# Altium footprint library Miscellaneous SMD.PcbLib: 82 footprints (part 2 of 7)
Each footprint in its own frame and in the unit in brackets; x right, y up, seen from the top. Pads: shape width x height; smd on the part's side, far side on the other; paste and mask are expansions set on the pad; w line width, h text height; cw(c..) or ccw(c..) is an arc to the next point about the centre after c.
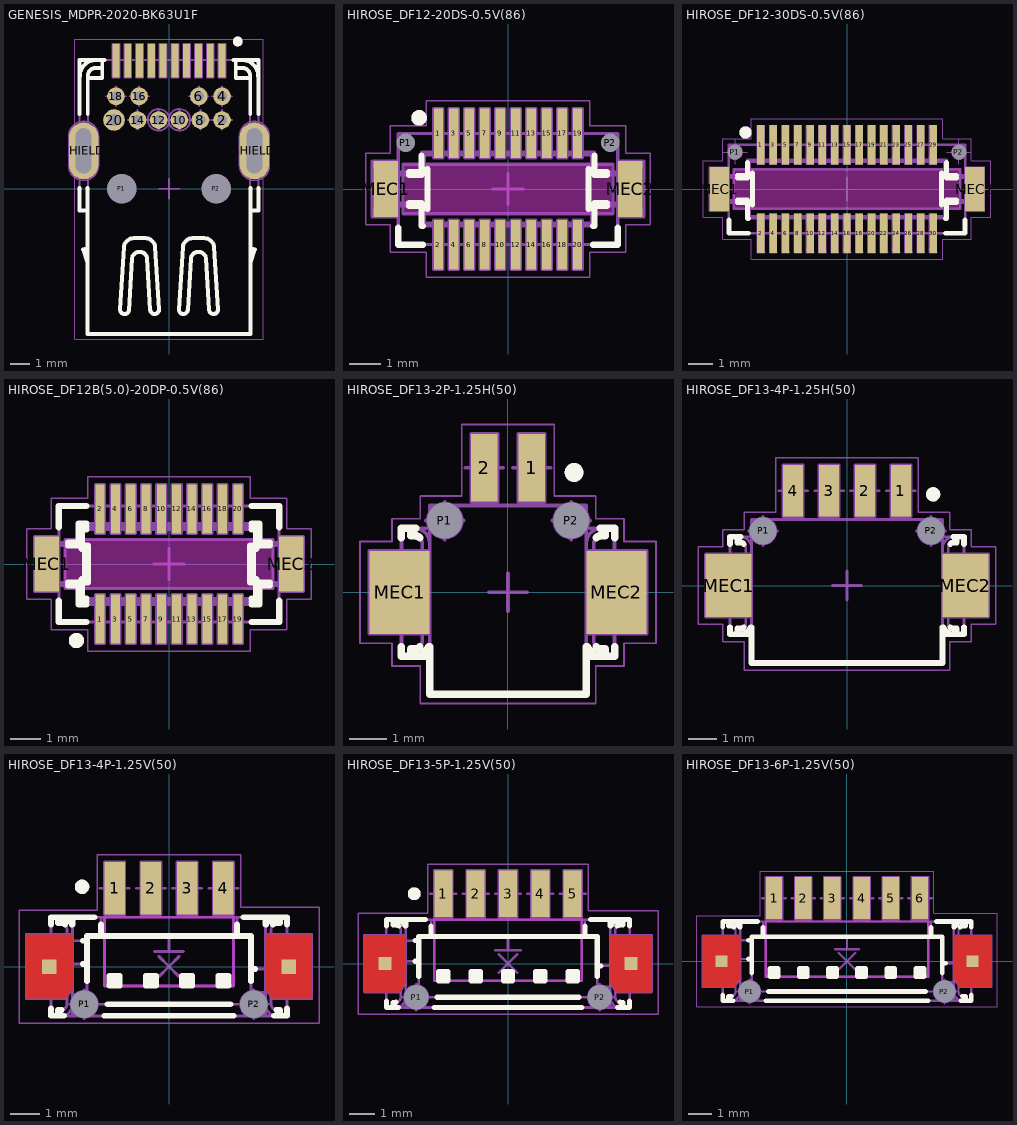
[diagram p1: the footprints below, top view; thin cyan lines are the x and y axes]

## GENESIS_MDPR-2020-BK63U1F [mm] "0.6mm Pitch, Mini DisplayPort Receptacle, 20 Positions, Right Angled"
height 8.2
pads (24):
  rect 0.35x1.7 smd: 1(2.7,6.52) 3(2.1,6.52) 5(1.5,6.52) 7(0.9,6.52) 9(0.3,6.52) 11(-0.3,6.52) 13(-0.9,6.52) 15(-1.5,6.52) 17(-2.1,6.52) 19(-2.7,6.52)
  round 0.9 hole 0.5: 2(2.7,3.5) 4(2.7,4.71) 6(1.52,4.71) 8(1.6,3.5) 10(0.53,3.5) 12(-0.53,3.5) 14(-1.6,3.5) 16(-1.52,4.71) 18(-2.7,4.71)
  round 1.1 hole 0.6: 20(-2.8,3.5)
  round 0.5 hole 1.5 unplated mask+0.5: P1(-2.4,0) P2(2.4,0)
  oval 1.5x2.9 hole 0.8 slot 2.3 at 90 deg: SHIELD(-4.35,1.93) SHIELD(4.35,1.93)
Top Overlay:
  circle w0.25: c3.5,7.5 r0.125
  lines w0.2: -4.55,0.048 -4.55,-1.11 -4.15,-1.11 ; -4.55,3.812 -4.55,6.552 -3.275,6.552 ; -4.536,5.752 cw(c-3.736,5.752) -3.75,6.552 ; -4.146,-3.745 -4.369,-3.098 -4.145,-3.021 ; -4.142,0.049 -4.15,-7.4 4.15,-7.4 4.142,0.049 ; -4.138,3.81 -4.136,5.752 cw(c-3.736,5.752) -3.743,6.152 -3.4,6.152 ; -4.136,5.63 -3.4,5.63 -3.4,6.552 ; 3.275,6.552 4.55,6.552 4.55,3.812 ; 3.4,6.152 3.743,6.152 cw(c3.736,5.752) 4.136,5.752 4.138,3.81 ; 3.4,6.552 3.4,5.63 4.136,5.63 ; 3.75,6.552 cw(c3.736,5.752) 4.536,5.752 ; 4.145,-3.021 4.369,-3.098 ; 4.146,-3.745 4.369,-3.097 ; 4.15,-1.11 4.55,-1.11 4.55,0.048 ; -2.492,-6.137 ccw(c-2.264,-6.149) -2.042,-6.2 -1.887,-3.551 cw(c-1.5,-3.605) -1.113,-3.551 -0.958,-6.167 ccw(c-0.733,-6.151) -0.508,-6.137 -0.707,-2.984 ccw(c-1.206,-3.016) -1.206,-2.516 -1.794,-2.516 ccw(c-1.794,-3.016) -2.293,-2.984 -2.492,-6.137 ; 0.508,-6.151 ccw(c0.733,-6.151) 0.958,-6.166 1.113,-3.551 cw(c1.5,-3.605) 1.887,-3.551 2.042,-6.166 ccw(c2.267,-6.151) 2.492,-6.151 2.293,-2.984 ccw(c1.794,-3.016) 1.794,-2.516 1.206,-2.516 ccw(c1.206,-3.016) 0.707,-2.984 0.508,-6.151
Mechanical 8:
  circle w0.1: c-2.4,0 r0.7
  circle w0.1: c2.4,0 r0.7
  circle w0.1: c-2.8,3.51 r0.35
  circle w0.1: c1.6,3.51 r0.3
  circle w0.1: c-1.6,3.51 r0.3
  circle w0.1: c-0.53,3.51 r0.3
  circle w0.1: c0.53,3.51 r0.3
  circle w0.1: c2.7,3.51 r0.3
  circle w0.1: c-2.7,4.71 r0.3
  circle w0.1: c-1.52,4.71 r0.3
  circle w0.1: c1.52,4.71 r0.3
  circle w0.1: c2.7,4.71 r0.3
  circle w0.1: c-0.53,3.51 r0.55
  circle w0.1: c0.53,3.51 r0.55
  lines w0.1: -4.85,1.93 -4.35,1.93 ; -4.35,1.43 -4.35,1.93 ; -4.35,2.43 -4.35,1.93 ; -3.85,1.93 -4.35,1.93 ; -3.3,3.51 -2.8,3.51 ; -3.2,4.71 -2.7,4.71 ; -2.9,0 -2.4,0 ; -2.8,3.01 -2.8,3.51 ; -2.8,4.01 -2.8,3.51 ; -2.7,4.21 -2.7,4.71 ; -2.7,5.21 -2.7,4.71 ; -2.4,-0.5 -2.4,0 ; -2.4,0.5 -2.4,0 ; -2.3,3.51 -2.8,3.51 ; -2.2,4.71 -2.7,4.71 ; -2.1,3.51 -1.6,3.51 ; -2.02,4.71 -1.52,4.71 ; -1.9,0 -2.4,0 ; -1.6,3.01 -1.6,3.51 ; -1.6,4.01 -1.6,3.51 ; -1.52,4.21 -1.52,4.71 ; -1.52,5.21 -1.52,4.71 ; -1.1,3.51 -1.6,3.51 ; -1.03,3.51 -0.53,3.51 ; -1.02,4.71 -1.52,4.71 ; -0.53,3.01 -0.53,3.51 ; -0.53,4.01 -0.53,3.51 ; -0.5,0 0,0 ; -0.03,3.51 -0.53,3.51 ; 0,-0.5 0,0 ; 0,0.5 0,0 ; 0.03,3.51 0.53,3.51 ; 0.5,0 0,0 ; 0.53,3.01 0.53,3.51 ; 0.53,4.01 0.53,3.51 ; 1.02,4.71 1.52,4.71 ; 1.03,3.51 0.53,3.51 ; 1.1,3.51 1.6,3.51 ; 1.52,4.21 1.52,4.71 ; 1.52,5.21 1.52,4.71 ; 1.6,3.01 1.6,3.51 ; 1.6,4.01 1.6,3.51 ; 1.9,0 2.4,0 ; 2.02,4.71 1.52,4.71 ; 2.1,3.51 1.6,3.51 ; 2.2,3.51 2.7,3.51 ; 2.2,4.71 2.7,4.71 ; 2.4,-0.5 2.4,0 ; 2.4,0.5 2.4,0 ; 2.7,3.01 2.7,3.51 ; 2.7,4.01 2.7,3.51 ; 2.7,4.21 2.7,4.71 ; 2.7,5.21 2.7,4.71 ; 2.9,0 2.4,0 ; 3.2,3.51 2.7,3.51 ; 3.2,4.71 2.7,4.71 ; 3.85,1.93 4.35,1.93 ; 4.35,1.43 4.35,1.93 ; 4.35,2.43 4.35,1.93 ; 4.85,1.93 4.35,1.93 ; -2.875,5.67 -2.525,5.67 ; -2.875,5.67 -2.875,7.37 -2.525,7.37 -2.525,5.67 ; -2.875,5.67 -2.7,6.52 -2.525,5.67 ; -2.275,5.67 -1.925,5.67 ; -2.275,5.67 -2.275,7.37 -1.925,7.37 -1.925,5.67 ; -2.275,5.67 -2.1,6.52 -1.925,5.67 ; -1.675,5.67 -1.325,5.67 ; -1.675,5.67 -1.675,7.37 -1.325,7.37 -1.325,5.67 ; -1.675,5.67 -1.5,6.52 -1.325,5.67 ; -1.075,5.67 -0.725,5.67 ; -1.075,5.67 -1.075,7.37 -0.725,7.37 -0.725,5.67 ; -1.075,5.67 -0.9,6.52 -0.725,5.67 ; -0.475,5.67 -0.125,5.67 ; -0.475,5.67 -0.475,7.37 -0.125,7.37 -0.125,5.67 ; -0.475,5.67 -0.3,6.52 -0.125,5.67 ; 0.125,5.67 0.475,5.67 ; 0.125,5.67 0.125,7.37 0.475,7.37 0.475,5.67 ; 0.125,5.67 0.3,6.52 0.475,5.67 ; 0.725,5.67 1.075,5.67 ; 0.725,5.67 0.725,7.37 1.075,7.37 1.075,5.67 ; 0.725,5.67 0.9,6.52 1.075,5.67 ; 1.325,5.67 1.675,5.67 ; 1.325,5.67 1.325,7.37 1.675,7.37 1.675,5.67 ; 1.325,5.67 1.5,6.52 1.675,5.67 ; 1.925,5.67 2.275,5.67 ; 1.925,5.67 1.925,7.37 2.275,7.37 2.275,5.67 ; 1.925,5.67 2.1,6.52 2.275,5.67 ; 2.525,5.67 2.875,5.67 ; 2.525,5.67 2.525,7.37 2.875,7.37 2.875,5.67 ; 2.525,5.67 2.7,6.52 2.875,5.67 ; -5.1,1.18 ccw(c-4.35,1.18) -3.6,1.18 -3.6,2.68 ccw(c-4.35,2.68) -5.1,2.68 -5.1,1.18 ; -4.75,1.18 ccw(c-4.35,1.18) -3.95,1.18 -3.95,2.68 ccw(c-4.35,2.68) -4.75,2.68 -4.75,1.18 ; 3.6,1.18 ccw(c4.35,1.18) 5.1,1.18 5.1,2.68 ccw(c4.35,2.68) 3.6,2.68 3.6,1.18 ; 3.95,1.18 ccw(c4.35,1.18) 4.75,1.18 4.75,2.68 ccw(c4.35,2.68) 3.95,2.68 3.95,1.18
Mechanical 14:
  circle w0.25: c3.5,7.5 r0.125
  lines w0.1: -4.536,5.752 cw(c-3.736,5.752) -3.75,6.552 ; -4.15,-1.11 -4.55,-1.11 -4.55,6.552 4.55,6.552 4.55,-1.11 4.15,-1.11 ; -4.146,-3.745 -4.369,-3.098 -4.145,-3.021 ; -4.136,5.63 -3.4,5.63 -3.4,6.552 ; -3.4,6.152 -3.743,6.152 ccw(c-3.736,5.752) -4.136,5.752 -4.15,-7.4 4.15,-7.4 4.136,5.752 ccw(c3.736,5.752) 3.743,6.152 3.4,6.152 ; 3.4,6.552 3.4,5.63 4.136,5.63 ; 3.75,6.552 cw(c3.736,5.752) 4.536,5.752 ; 4.145,-3.021 4.369,-3.098 ; 4.146,-3.745 4.369,-3.097 ; -2.492,-6.137 ccw(c-2.264,-6.149) -2.042,-6.2 -1.887,-3.551 cw(c-1.5,-3.605) -1.113,-3.551 -0.958,-6.167 ccw(c-0.733,-6.151) -0.508,-6.137 -0.707,-2.984 ccw(c-1.206,-3.016) -1.206,-2.516 -1.794,-2.516 ccw(c-1.794,-3.016) -2.293,-2.984 -2.492,-6.137 ; 0.508,-6.151 ccw(c0.733,-6.151) 0.958,-6.166 1.113,-3.551 cw(c1.5,-3.605) 1.887,-3.551 2.042,-6.166 ccw(c2.267,-6.151) 2.492,-6.151 2.293,-2.984 ccw(c1.794,-3.016) 1.794,-2.516 1.206,-2.516 ccw(c1.206,-3.016) 0.707,-2.984 0.508,-6.151
Mechanical 15:
  lines w0.05: -4.8,-7.65 -4.8,7.62 4.8,7.62 4.8,-7.65 -4.8,-7.65
3D body "GENESIS_MDPR-2020-BK63U1F.stp": height 8.38, standoff -2.3, extent -4.6,-7.4 4.6,6.957

## HIROSE_DF12-20DS-0.5V(86) [mm] "20 Contacts, Pitch 0.5mm, Surface Mount Board to Board Receptacle, DF12 Series"
height 2.9
pads (24):
  rect 0.3x1.6 smd: 1(-2.25,1.8) 2(-2.25,-1.8) 3(-1.75,1.8) 4(-1.75,-1.8) 5(-1.25,1.8) 6(-1.25,-1.8) 7(-0.75,1.8) 8(-0.75,-1.8) 9(-0.25,1.8) 10(-0.25,-1.8) 11(0.25,1.8) 12(0.25,-1.8) 13(0.75,1.8) 14(0.75,-1.8) 15(1.25,1.8) 16(1.25,-1.8) 17(1.75,1.8) 18(1.75,-1.8) 19(2.25,1.8) 20(2.25,-1.8)
  rect 0.8x1.8 smd: MEC1(-3.95,0) MEC2(3.95,0)
  round 0.5 hole 0.6 unplated mask+0.05: P1(-3.3,1.5) P2(3.3,1.5)
Top Layer keep-out:
  rectangle: -3.35,-0.8 3.35,0.8
Top Overlay:
  circle w0.25: c-2.875,2.3 r0.125
  lines w0.2: -3.55,-1.25 -3.55,-1.8 -2.75,-1.8 ; -3.2,-0.55 -2.8,-0.55 ; -3.2,-0.45 -2.8,-0.45 -2.8,-1.2 -2.75,-1.2 ; -3.2,0.45 -2.8,0.45 -2.8,1.085 ; -3.2,0.55 -2.8,0.55 ; -2.8,-0.65 -2.75,-0.65 ; -2.8,0.65 -2.75,0.65 ; -2.6,-0.65 -2.6,0.65 ; 2.6,-0.65 2.6,0.65 ; 2.75,-1.8 3.55,-1.8 3.55,-1.25 ; 2.75,-1.2 2.8,-1.2 2.8,-0.45 3.2,-0.45 ; 2.75,-0.65 2.8,-0.65 ; 2.75,0.65 2.8,0.65 ; 2.8,-0.55 3.2,-0.55 ; 2.8,0.55 3.2,0.55 ; 2.8,1.085 2.8,0.45 3.2,0.45
Mechanical 8:
  lines w0.1: -0.5,0 0,0 ; 0,-0.5 0,0 ; 0,0.5 0,0 ; 0.5,0 0,0 ; -4.4,-0.9 -3.6,-0.9 -3.6,0.9 -4.4,0.9 ; -4.4,-0.9 -4.4,0.9 ; -4.4,-0.9 -4,0 -4.4,0.9 ; -2.4,-2.6 -2.1,-2.6 ; -2.4,-2.6 -2.4,-1 -2.1,-1 -2.1,-2.6 ; -2.4,-2.6 -2.25,-1.8 -2.1,-2.6 ; -2.4,2.6 -2.1,2.6 ; -2.4,2.6 -2.4,1 -2.1,1 -2.1,2.6 ; -2.4,2.6 -2.25,1.8 -2.1,2.6 ; -1.9,-2.6 -1.6,-2.6 ; -1.9,-2.6 -1.9,-1 -1.6,-1 -1.6,-2.6 ; -1.9,-2.6 -1.75,-1.8 -1.6,-2.6 ; -1.9,2.6 -1.6,2.6 ; -1.9,2.6 -1.9,1 -1.6,1 -1.6,2.6 ; -1.9,2.6 -1.75,1.8 -1.6,2.6 ; -1.4,-2.6 -1.1,-2.6 ; -1.4,-2.6 -1.4,-1 -1.1,-1 -1.1,-2.6 ; -1.4,-2.6 -1.25,-1.8 -1.1,-2.6 ; -1.4,2.6 -1.1,2.6 ; -1.4,2.6 -1.4,1 -1.1,1 -1.1,2.6 ; -1.4,2.6 -1.25,1.8 -1.1,2.6 ; -0.9,-2.6 -0.6,-2.6 ; -0.9,-2.6 -0.9,-1 -0.6,-1 -0.6,-2.6 ; -0.9,-2.6 -0.75,-1.8 -0.6,-2.6 ; -0.9,2.6 -0.6,2.6 ; -0.9,2.6 -0.9,1 -0.6,1 -0.6,2.6 ; -0.9,2.6 -0.75,1.8 -0.6,2.6 ; -0.4,-2.6 -0.1,-2.6 ; -0.4,-2.6 -0.4,-1 -0.1,-1 -0.1,-2.6 ; -0.4,-2.6 -0.25,-1.8 -0.1,-2.6 ; -0.4,2.6 -0.1,2.6 ; -0.4,2.6 -0.4,1 -0.1,1 -0.1,2.6 ; -0.4,2.6 -0.25,1.8 -0.1,2.6 ; 0.1,-2.6 0.4,-2.6 ; 0.1,-2.6 0.1,-1 0.4,-1 0.4,-2.6 ; 0.1,-2.6 0.25,-1.8 0.4,-2.6 ; 0.1,2.6 0.4,2.6 ; 0.1,2.6 0.1,1 0.4,1 0.4,2.6 ; 0.1,2.6 0.25,1.8 0.4,2.6 ; 0.6,-2.6 0.9,-2.6 ; 0.6,-2.6 0.6,-1 0.9,-1 0.9,-2.6 ; 0.6,-2.6 0.75,-1.8 0.9,-2.6 ; 0.6,2.6 0.9,2.6 ; 0.6,2.6 0.6,1 0.9,1 0.9,2.6 ; 0.6,2.6 0.75,1.8 0.9,2.6 ; 1.1,-2.6 1.4,-2.6 ; 1.1,-2.6 1.1,-1 1.4,-1 1.4,-2.6 ; 1.1,-2.6 1.25,-1.8 1.4,-2.6 ; 1.1,2.6 1.4,2.6 ; 1.1,2.6 1.1,1 1.4,1 1.4,2.6 ; 1.1,2.6 1.25,1.8 1.4,2.6 ; 1.6,-2.6 1.9,-2.6 ; 1.6,-2.6 1.6,-1 1.9,-1 1.9,-2.6 ; 1.6,-2.6 1.75,-1.8 1.9,-2.6 ; 1.6,2.6 1.9,2.6 ; 1.6,2.6 1.6,1 1.9,1 1.9,2.6 ; 1.6,2.6 1.75,1.8 1.9,2.6 ; 2.1,-2.6 2.4,-2.6 ; 2.1,-2.6 2.1,-1 2.4,-1 2.4,-2.6 ; 2.1,-2.6 2.25,-1.8 2.4,-2.6 ; 2.1,2.6 2.4,2.6 ; 2.1,2.6 2.1,1 2.4,1 2.4,2.6 ; 2.1,2.6 2.25,1.8 2.4,2.6 ; 4.4,-0.9 3.6,-0.9 3.6,0.9 4.4,0.9 ; 4.4,-0.9 4.4,0.9 ; 4.4,-0.9 4,0 4.4,0.9 ; -3.4,-0.8 3.4,-0.8 3.4,0.8 -3.4,0.8 -3.4,-0.8
Mechanical 14:
  circle w0.25: c-2.875,2.3 r0.125
  lines w0.1: -3.95,-0.05 -3.95,0.75 ; -3.85,-0.05 -3.85,0.75 ; -3.8,-0.25 -3.8,-0.05 ; -3.7,-0.05 -4.05,-0.05 -4.05,0.75 -3.55,0.75 ; -3.7,0.75 -3.7,-0.25 -4,-0.25 -4,-0.75 -3.55,-0.75 ; -3.55,-0.55 -2.8,-0.55 ; -3.55,-0.45 -2.8,-0.45 -2.8,-1.2 ; -3.55,0.45 -2.8,0.45 -2.8,1.2 ; -3.55,0.55 -2.8,0.55 ; -2.8,-0.65 -2.6,-0.65 -2.6,0.65 -2.8,0.65 ; -2.7,-0.65 -2.7,-1.1 ; -2.7,0.65 -2.7,1.1 ; -2.35,-1.2 -2.35,-1.37 -2.15,-1.37 -2.15,-1.2 ; -2.35,1.2 -2.35,1.37 -2.15,1.37 -2.15,1.2 ; -1.85,-1.2 -1.85,-1.37 -1.65,-1.37 -1.65,-1.2 ; -1.85,1.2 -1.85,1.37 -1.65,1.37 -1.65,1.2 ; -1.35,-1.2 -1.35,-1.37 -1.15,-1.37 -1.15,-1.2 ; -1.35,1.2 -1.35,1.37 -1.15,1.37 -1.15,1.2 ; -0.85,-1.2 -0.85,-1.37 -0.65,-1.37 -0.65,-1.2 ; -0.85,1.2 -0.85,1.37 -0.65,1.37 -0.65,1.2 ; -0.35,-1.2 -0.35,-1.37 -0.15,-1.37 -0.15,-1.2 ; -0.35,1.2 -0.35,1.37 -0.15,1.37 -0.15,1.2 ; 0.15,-1.2 0.15,-1.37 0.35,-1.37 0.35,-1.2 ; 0.15,1.2 0.15,1.37 0.35,1.37 0.35,1.2 ; 0.65,-1.2 0.65,-1.37 0.85,-1.37 0.85,-1.2 ; 0.65,1.2 0.65,1.37 0.85,1.37 0.85,1.2 ; 1.15,-1.2 1.15,-1.37 1.35,-1.37 1.35,-1.2 ; 1.15,1.2 1.15,1.37 1.35,1.37 1.35,1.2 ; 1.65,-1.2 1.65,-1.37 1.85,-1.37 1.85,-1.2 ; 1.65,1.2 1.65,1.37 1.85,1.37 1.85,1.2 ; 2.15,-1.2 2.15,-1.37 2.35,-1.37 2.35,-1.2 ; 2.15,1.2 2.15,1.37 2.35,1.37 2.35,1.2 ; 2.7,-0.65 2.7,-1.1 ; 2.7,0.65 2.7,1.1 ; 2.8,-0.65 2.6,-0.65 2.6,0.65 2.8,0.65 ; 2.8,-0.55 3.55,-0.55 ; 2.8,0.55 3.55,0.55 ; 3.55,-0.75 4,-0.75 4,-0.25 3.7,-0.25 3.7,0.75 ; 3.55,-0.45 2.8,-0.45 2.8,-1.2 ; 3.55,0.45 2.8,0.45 2.8,1.2 ; 3.55,0.75 4.05,0.75 4.05,-0.05 3.7,-0.05 ; 3.8,-0.25 3.8,-0.05 ; 3.85,-0.05 3.85,0.75 ; 3.95,-0.05 3.95,0.75 ; -2.8,-1.2 2.8,-1.2 ; -2.8,-1.2 -2.7,-1.1 ; -2.8,1.2 2.8,1.2 ; -2.8,1.2 -2.7,1.1 ; -2.7,-1.1 2.7,-1.1 ; -2.7,1.1 2.7,1.1 ; 2.7,-1.1 2.8,-1.2 ; 2.7,1.1 2.8,1.2 ; -3.55,-1.8 -3.55,1.8 3.55,1.8 3.55,-1.8 -3.55,-1.8
Mechanical 15:
  lines w0.05: -4.6,-1.15 -3.8,-1.15 -3.8,-2.05 -2.65,-2.05 -2.65,-2.85 2.65,-2.85 2.65,-2.05 3.8,-2.05 3.8,-1.15 4.6,-1.15 4.6,1.15 3.8,1.15 3.8,2.05 2.65,2.05 2.65,2.85 -2.65,2.85 -2.65,2.05 -3.8,2.05 -3.8,1.15 -4.6,1.15 -4.6,-1.15
3D body "HIROSE_DF12-20DS-0.5V(86).stp": height 2.7, standoff -0.6, extent -4.05,-2.3 4.05,2.3

## HIROSE_DF12-30DS-0.5V(86) [mm] "30 Contacts, Pitch 0.5mm, Surface Mount Board to Board Receptacle, DF12 Series"
height 2.9
pads (34):
  rect 0.3x1.6 smd: 1(-3.5,1.8) 2(-3.5,-1.8) 3(-3,1.8) 4(-3,-1.8) 5(-2.5,1.8) 6(-2.5,-1.8) 7(-2,1.8) 8(-2,-1.8) 9(-1.5,1.8) 10(-1.5,-1.8) 11(-1,1.8) 12(-1,-1.8) 13(-0.5,1.8) 14(-0.5,-1.8) 15(0,1.8) 16(0,-1.8) 17(0.5,1.8) 18(0.5,-1.8) 19(1,1.8) 20(1,-1.8) 21(1.5,1.8) 22(1.5,-1.8) 23(2,1.8) 24(2,-1.8) 25(2.5,1.8) 26(2.5,-1.8) 27(3,1.8) 28(3,-1.8) 29(3.5,1.8) 30(3.5,-1.8)
  rect 0.8x1.8 smd: MEC1(-5.2,0) MEC2(5.2,0)
  round 0.5 hole 0.6 unplated mask+0.05: P1(-4.55,1.5) P2(4.55,1.5)
Top Layer keep-out:
  rectangle: -4.6,-0.8 4.6,0.8
Top Overlay:
  circle w0.25: c-4.125,2.3 r0.125
  lines w0.2: -4.8,-1.25 -4.8,-1.8 -4,-1.8 ; -4.45,-0.55 -4.05,-0.55 ; -4.45,-0.45 -4.05,-0.45 -4.05,-1.2 -4,-1.2 ; -4.45,0.45 -4.05,0.45 -4.05,1.085 ; -4.45,0.55 -4.05,0.55 ; -4.05,-0.65 -4,-0.65 ; -4.05,0.65 -4,0.65 ; -3.85,-0.65 -3.85,0.65 ; 3.85,-0.65 3.85,0.65 ; 4,-1.8 4.8,-1.8 4.8,-1.25 ; 4,-1.2 4.05,-1.2 4.05,-0.45 4.45,-0.45 ; 4,-0.65 4.05,-0.65 ; 4,0.65 4.05,0.65 ; 4.05,-0.55 4.45,-0.55 ; 4.05,0.55 4.45,0.55 ; 4.05,1.085 4.05,0.45 4.45,0.45
Mechanical 8:
  drawing of 214 lines, arcs and shapes, not listed
Mechanical 14:
  circle w0.25: c-4.125,2.3 r0.125
  lines w0.1: -5.2,-0.05 -5.2,0.75 ; -5.1,-0.05 -5.1,0.75 ; -5.05,-0.25 -5.05,-0.05 ; -4.95,-0.05 -5.3,-0.05 -5.3,0.75 -4.8,0.75 ; -4.95,0.75 -4.95,-0.25 -5.25,-0.25 -5.25,-0.75 -4.8,-0.75 ; -4.8,-0.55 -4.05,-0.55 ; -4.8,-0.45 -4.05,-0.45 -4.05,-1.2 ; -4.8,0.45 -4.05,0.45 -4.05,1.2 ; -4.8,0.55 -4.05,0.55 ; -4.05,-0.65 -3.85,-0.65 -3.85,0.65 -4.05,0.65 ; -3.95,-0.65 -3.95,-1.1 ; -3.95,0.65 -3.95,1.1 ; -3.6,-1.2 -3.6,-1.37 -3.4,-1.37 -3.4,-1.2 ; -3.6,1.2 -3.6,1.37 -3.4,1.37 -3.4,1.2 ; -3.1,-1.2 -3.1,-1.37 -2.9,-1.37 -2.9,-1.2 ; -3.1,1.2 -3.1,1.37 -2.9,1.37 -2.9,1.2 ; -2.6,-1.2 -2.6,-1.37 -2.4,-1.37 -2.4,-1.2 ; -2.6,1.2 -2.6,1.37 -2.4,1.37 -2.4,1.2 ; -2.1,-1.2 -2.1,-1.37 -1.9,-1.37 -1.9,-1.2 ; -2.1,1.2 -2.1,1.37 -1.9,1.37 -1.9,1.2 ; -1.6,-1.2 -1.6,-1.37 -1.4,-1.37 -1.4,-1.2 ; -1.6,1.2 -1.6,1.37 -1.4,1.37 -1.4,1.2 ; -1.1,-1.2 -1.1,-1.37 -0.9,-1.37 -0.9,-1.2 ; -1.1,1.2 -1.1,1.37 -0.9,1.37 -0.9,1.2 ; -0.6,-1.2 -0.6,-1.37 -0.4,-1.37 -0.4,-1.2 ; -0.6,1.2 -0.6,1.37 -0.4,1.37 -0.4,1.2 ; -0.1,-1.2 -0.1,-1.37 0.1,-1.37 0.1,-1.2 ; -0.1,1.2 -0.1,1.37 0.1,1.37 0.1,1.2 ; 0.4,-1.2 0.4,-1.37 0.6,-1.37 0.6,-1.2 ; 0.4,1.2 0.4,1.37 0.6,1.37 0.6,1.2 ; 0.9,-1.2 0.9,-1.37 1.1,-1.37 1.1,-1.2 ; 0.9,1.2 0.9,1.37 1.1,1.37 1.1,1.2 ; 1.4,-1.2 1.4,-1.37 1.6,-1.37 1.6,-1.2 ; 1.4,1.2 1.4,1.37 1.6,1.37 1.6,1.2 ; 1.9,-1.2 1.9,-1.37 2.1,-1.37 2.1,-1.2 ; 1.9,1.2 1.9,1.37 2.1,1.37 2.1,1.2 ; 2.4,-1.2 2.4,-1.37 2.6,-1.37 2.6,-1.2 ; 2.4,1.2 2.4,1.37 2.6,1.37 2.6,1.2 ; 2.9,-1.2 2.9,-1.37 3.1,-1.37 3.1,-1.2 ; 2.9,1.2 2.9,1.37 3.1,1.37 3.1,1.2 ; 3.4,-1.2 3.4,-1.37 3.6,-1.37 3.6,-1.2 ; 3.4,1.2 3.4,1.37 3.6,1.37 3.6,1.2 ; 3.95,-0.65 3.95,-1.1 ; 3.95,0.65 3.95,1.1 ; 4.05,-0.65 3.85,-0.65 3.85,0.65 4.05,0.65 ; 4.05,-0.55 4.8,-0.55 ; 4.05,0.55 4.8,0.55 ; 4.8,-0.75 5.25,-0.75 5.25,-0.25 4.95,-0.25 4.95,0.75 ; 4.8,-0.45 4.05,-0.45 4.05,-1.2 ; 4.8,0.45 4.05,0.45 4.05,1.2 ; 4.8,0.75 5.3,0.75 5.3,-0.05 4.95,-0.05 ; 5.05,-0.25 5.05,-0.05 ; 5.1,-0.05 5.1,0.75 ; 5.2,-0.05 5.2,0.75 ; -4.05,-1.2 4.05,-1.2 ; -4.05,-1.2 -3.95,-1.1 ; -4.05,1.2 4.05,1.2 ; -4.05,1.2 -3.95,1.1 ; -3.95,-1.1 3.95,-1.1 ; -3.95,1.1 3.95,1.1 ; 3.95,-1.1 4.05,-1.2 ; 3.95,1.1 4.05,1.2 ; -4.8,-1.8 -4.8,1.8 4.8,1.8 4.8,-1.8 -4.8,-1.8
Mechanical 15:
  lines w0.05: -5.85,-1.15 -5.05,-1.15 -5.05,-2.05 -3.9,-2.05 -3.9,-2.85 3.9,-2.85 3.9,-2.05 5.05,-2.05 5.05,-1.15 5.85,-1.15 5.85,1.15 5.05,1.15 5.05,2.05 3.9,2.05 3.9,2.85 -3.9,2.85 -3.9,2.05 -5.05,2.05 -5.05,1.15 -5.85,1.15 -5.85,-1.15
3D body "HIROSE_DF12-30DS-0.5V.stp": height 2.7, standoff -0.6, extent -5.3,-2.3 5.3,2.3

## HIROSE_DF12B(5.0)-20DP-0.5V(86) [mm] "20 Contacts, Pitch 0.5mm, Surface Mount Board to Board Plug, DF12 Series"
height 4.5
pads (22):
  rect 0.3x1.6 smd: 1(-2.25,-1.8) 2(-2.25,1.8) 3(-1.75,-1.8) 4(-1.75,1.8) 5(-1.25,-1.8) 6(-1.25,1.8) 7(-0.75,-1.8) 8(-0.75,1.8) 9(-0.25,-1.8) 10(-0.25,1.8) 11(0.25,-1.8) 12(0.25,1.8) 13(0.75,-1.8) 14(0.75,1.8) 15(1.25,-1.8) 16(1.25,1.8) 17(1.75,-1.8) 18(1.75,1.8) 19(2.25,-1.8) 20(2.25,1.8)
  rect 0.8x1.8 smd: MEC1(-4,0) MEC2(4,0)
Top Layer keep-out:
  region: -3.4,0.8 -3.4,-0.8 3.4,-0.8 3.4,0.8
Top Overlay:
  circle w0.25: c-3.025,-2.5 r0.125
  lines w0.2: -3.6,-1.2 -3.6,-1.9 -2.7,-1.9 ; -3.6,1.2 -3.6,1.9 -2.7,1.9 ; -3.3,-0.7 -2.95,-0.7 ; -3.3,-0.6 -2.85,-0.6 ; -3.3,0.6 -2.85,0.6 ; -3.3,0.7 -2.95,0.7 ; -2.85,-1.125 -2.7,-1.125 ; -2.85,1.125 -2.7,1.125 ; -2.7,-1.325 -2.95,-1.325 ; -2.7,-1.225 -2.85,-1.225 ; -2.7,1.225 -2.85,1.225 ; -2.7,1.325 -2.95,1.325 ; 2.7,-1.9 3.6,-1.9 3.6,-1.2 ; 2.7,-1.325 2.95,-1.325 ; 2.7,-1.225 2.85,-1.225 ; 2.7,-1.125 2.85,-1.125 ; 2.7,1.125 2.85,1.125 ; 2.7,1.225 2.85,1.225 ; 2.7,1.325 2.95,1.325 ; 2.7,1.9 3.6,1.9 3.6,1.2 ; 3.3,-0.7 2.95,-0.7 ; 3.3,-0.6 2.85,-0.6 ; 3.3,0.6 2.85,0.6 ; 3.3,0.7 2.95,0.7 ; -2.95,-1.325 -2.95,-0.7 ; -2.95,-1.325 -2.85,-1.225 ; -2.95,-0.7 -2.85,-0.6 ; -2.95,0.7 -2.95,1.325 ; -2.95,0.7 -2.85,0.6 ; -2.95,1.325 -2.85,1.225 ; -2.85,-1.225 -2.85,-0.6 ; -2.85,-0.6 -2.65,-0.6 ; -2.85,-0.6 -2.85,-0.5 -2.75,-0.5 ; -2.85,0.6 -2.85,1.225 ; -2.85,0.6 -2.65,0.6 ; -2.85,0.6 -2.85,0.5 -2.75,0.5 ; -2.75,-0.5 -2.75,0.5 ; -2.75,-0.5 -2.65,-0.6 ; -2.75,0.5 -2.65,0.6 ; -2.65,-0.6 -2.65,0.6 ; 2.65,-0.6 2.65,0.6 ; 2.65,-0.6 2.85,-0.6 ; 2.65,-0.6 2.75,-0.5 ; 2.65,0.6 2.85,0.6 ; 2.65,0.6 2.75,0.5 ; 2.75,-0.5 2.85,-0.5 2.85,-0.6 ; 2.75,-0.5 2.75,0.5 ; 2.75,0.5 2.85,0.5 2.85,0.6 ; 2.85,-1.225 2.85,-0.6 ; 2.85,-1.225 2.95,-1.325 ; 2.85,-0.6 2.95,-0.7 ; 2.85,0.6 2.85,1.225 ; 2.85,0.6 2.95,0.7 ; 2.85,1.225 2.95,1.325 ; 2.95,-1.325 2.95,-0.7 ; 2.95,0.7 2.95,1.325
Mechanical 8:
  lines w0.1: -0.5,0 0,0 ; 0,-0.5 0,0 ; 0,0.5 0,0 ; 0.5,0 0,0 ; -4.4,-0.9 -3.6,-0.9 -3.6,0.9 -4.4,0.9 ; -4.4,-0.9 -4.4,0.9 ; -4.4,-0.9 -4,0 -4.4,0.9 ; -2.4,-2.6 -2.1,-2.6 ; -2.4,-2.6 -2.4,-1 -2.1,-1 -2.1,-2.6 ; -2.4,-2.6 -2.25,-1.8 -2.1,-2.6 ; -2.4,2.6 -2.1,2.6 ; -2.4,2.6 -2.4,1 -2.1,1 -2.1,2.6 ; -2.4,2.6 -2.25,1.8 -2.1,2.6 ; -1.9,-2.6 -1.6,-2.6 ; -1.9,-2.6 -1.9,-1 -1.6,-1 -1.6,-2.6 ; -1.9,-2.6 -1.75,-1.8 -1.6,-2.6 ; -1.9,2.6 -1.6,2.6 ; -1.9,2.6 -1.9,1 -1.6,1 -1.6,2.6 ; -1.9,2.6 -1.75,1.8 -1.6,2.6 ; -1.4,-2.6 -1.1,-2.6 ; -1.4,-2.6 -1.4,-1 -1.1,-1 -1.1,-2.6 ; -1.4,-2.6 -1.25,-1.8 -1.1,-2.6 ; -1.4,2.6 -1.1,2.6 ; -1.4,2.6 -1.4,1 -1.1,1 -1.1,2.6 ; -1.4,2.6 -1.25,1.8 -1.1,2.6 ; -0.9,-2.6 -0.6,-2.6 ; -0.9,-2.6 -0.9,-1 -0.6,-1 -0.6,-2.6 ; -0.9,-2.6 -0.75,-1.8 -0.6,-2.6 ; -0.9,2.6 -0.6,2.6 ; -0.9,2.6 -0.9,1 -0.6,1 -0.6,2.6 ; -0.9,2.6 -0.75,1.8 -0.6,2.6 ; -0.4,-2.6 -0.1,-2.6 ; -0.4,-2.6 -0.4,-1 -0.1,-1 -0.1,-2.6 ; -0.4,-2.6 -0.25,-1.8 -0.1,-2.6 ; -0.4,2.6 -0.1,2.6 ; -0.4,2.6 -0.4,1 -0.1,1 -0.1,2.6 ; -0.4,2.6 -0.25,1.8 -0.1,2.6 ; 0.1,-2.6 0.4,-2.6 ; 0.1,-2.6 0.1,-1 0.4,-1 0.4,-2.6 ; 0.1,-2.6 0.25,-1.8 0.4,-2.6 ; 0.1,2.6 0.4,2.6 ; 0.1,2.6 0.1,1 0.4,1 0.4,2.6 ; 0.1,2.6 0.25,1.8 0.4,2.6 ; 0.6,-2.6 0.9,-2.6 ; 0.6,-2.6 0.6,-1 0.9,-1 0.9,-2.6 ; 0.6,-2.6 0.75,-1.8 0.9,-2.6 ; 0.6,2.6 0.9,2.6 ; 0.6,2.6 0.6,1 0.9,1 0.9,2.6 ; 0.6,2.6 0.75,1.8 0.9,2.6 ; 1.1,-2.6 1.4,-2.6 ; 1.1,-2.6 1.1,-1 1.4,-1 1.4,-2.6 ; 1.1,-2.6 1.25,-1.8 1.4,-2.6 ; 1.1,2.6 1.4,2.6 ; 1.1,2.6 1.1,1 1.4,1 1.4,2.6 ; 1.1,2.6 1.25,1.8 1.4,2.6 ; 1.6,-2.6 1.9,-2.6 ; 1.6,-2.6 1.6,-1 1.9,-1 1.9,-2.6 ; 1.6,-2.6 1.75,-1.8 1.9,-2.6 ; 1.6,2.6 1.9,2.6 ; 1.6,2.6 1.6,1 1.9,1 1.9,2.6 ; 1.6,2.6 1.75,1.8 1.9,2.6 ; 2.1,-2.6 2.4,-2.6 ; 2.1,-2.6 2.1,-1 2.4,-1 2.4,-2.6 ; 2.1,-2.6 2.25,-1.8 2.4,-2.6 ; 2.1,2.6 2.4,2.6 ; 2.1,2.6 2.1,1 2.4,1 2.4,2.6 ; 2.1,2.6 2.25,1.8 2.4,2.6 ; 4.4,-0.9 3.6,-0.9 3.6,0.9 4.4,0.9 ; 4.4,-0.9 4.4,0.9 ; 4.4,-0.9 4,0 4.4,0.9 ; -3.4,-0.8 3.4,-0.8 3.4,0.8 -3.4,0.8 -3.4,-0.8
Mechanical 14:
  drawing of 217 lines, arcs and shapes, not listed
Mechanical 15:
  lines w0.05: -4.65,-1.15 -4.65,1.15 -3.85,1.15 -3.85,2.15 -2.65,2.15 -2.65,2.85 2.65,2.85 2.65,2.15 3.85,2.15 3.85,1.15 4.65,1.15 4.65,-1.15 3.85,-1.15 3.85,-2.15 2.65,-2.15 2.65,-2.85 -2.65,-2.85 -2.65,-2.15 -3.85,-2.15 -3.85,-1.15 -4.65,-1.15
3D body "HIROSE_DF12B(5.0)-20DP-0.5V(86).stp": height 4.3, standoff 0, extent -4.05,-2.3 4.05,2.3

## HIROSE_DF13-2P-1.25H(50) [mm] "Pitch 1.25mm, Single Row, 2 Contacts, Right Angle SMT Header, Series DF13"
height 3.6
pads (6):
  rect 0.7x1.8 smd: 1(0.625,3.3) 2(-0.625,3.3)
  rect 1.6x2.2 smd: MEC1(-2.875,0) MEC2(2.875,0)
  round 0.5 hole 0.95 unplated mask+0.225: P1(-1.675,1.9) P2(1.675,1.9)
Top Overlay:
  circle w0.25: c1.75,3.176 r0.125
  lines w0.2: -2.825,-1.45 -2.825,-1.7 -2.075,-1.7 ; -2.825,1.45 -2.825,1.7 -2.45,1.7 ; -2.449,1.699 ccw(c-2.475,1.3) -2.475,1.7 -2.575,1.7 -2.575,1.5 -2.475,1.5 cw(c-2.475,1.3) -2.343,1.45 ; -2.343,-1.45 cw(c-2.475,-1.3) -2.475,-1.5 -2.575,-1.5 -2.575,-1.7 -2.475,-1.7 ccw(c-2.475,-1.3) -2.104,-1.45 ; -2.075,-1.45 -2.075,-2.7 0,-2.7 2.075,-2.7 2.075,-1.45 ; 2.075,-1.7 2.825,-1.7 2.825,-1.45 ; 2.104,-1.45 ccw(c2.475,-1.3) 2.475,-1.7 2.575,-1.7 2.575,-1.5 2.475,-1.5 cw(c2.475,-1.3) 2.343,-1.45 ; 2.343,1.45 cw(c2.475,1.3) 2.475,1.5 2.575,1.5 2.575,1.7 2.475,1.7 ccw(c2.475,1.3) 2.449,1.699 ; 2.45,1.7 2.825,1.7 2.825,1.45
Mechanical 8:
  circle w0.1: c-1.675,1.9 r0.45
  circle w0.1: c1.675,1.9 r0.45
  lines w0.1: -3.375,0 -2.875,0 ; -2.875,-0.5 -2.875,0 ; -2.875,0.5 -2.875,0 ; -2.375,0 -2.875,0 ; -2.175,1.9 -1.675,1.9 ; -1.675,1.4 -1.675,1.9 ; -1.675,2.4 -1.675,1.9 ; -1.175,1.9 -1.675,1.9 ; -1.125,3.3 -0.625,3.3 ; -0.625,2.8 -0.625,3.3 ; -0.625,3.8 -0.625,3.3 ; -0.5,0 0,0 ; -0.125,3.3 -0.625,3.3 ; 0,-0.5 0,0 ; 0,0.5 0,0 ; 0.125,3.3 0.625,3.3 ; 0.5,0 0,0 ; 0.625,2.8 0.625,3.3 ; 0.625,3.8 0.625,3.3 ; 1.125,3.3 0.625,3.3 ; 1.175,1.9 1.675,1.9 ; 1.675,1.4 1.675,1.9 ; 1.675,2.4 1.675,1.9 ; 2.175,1.9 1.675,1.9 ; 2.375,0 2.875,0 ; 2.875,-0.5 2.875,0 ; 2.875,0.5 2.875,0 ; 3.375,0 2.875,0 ; -3.675,-1.1 -2.075,-1.1 -2.075,1.1 -3.675,1.1 -3.675,-1.1 ; -0.975,2.4 -0.275,2.4 -0.275,4.2 -0.975,4.2 -0.975,2.4 ; 0.275,2.4 0.975,2.4 0.975,4.2 0.275,4.2 0.275,2.4 ; 2.075,-1.1 3.675,-1.1 3.675,1.1 2.075,1.1 2.075,-1.1
Mechanical 14:
  circle w0.25: c1.75,3.176 r0.125
  lines w0.1: -2.825,-0.9 -2.825,-1.7 -2.075,-1.7 ; -2.825,0.9 -2.825,1.7 -2.075,1.7 ; -2.275,-0.9 -3.575,-0.9 -3.575,0.9 -2.275,0.9 ; -2.075,-1.3 cw(c-2.475,-1.3) -2.475,-1.7 -2.575,-1.7 -2.575,-1.5 -2.475,-1.5 ccw(c-2.475,-1.3) -2.275,-1.3 -2.275,1.3 ccw(c-2.475,1.3) -2.475,1.5 -2.575,1.5 -2.575,1.7 -2.475,1.7 cw(c-2.475,1.3) -2.075,1.3 ; -0.8,2.3 -0.8,3.5 -0.725,3.8 -0.525,3.8 -0.45,3.5 -0.45,2.3 ; 0.45,2.3 0.45,3.5 0.525,3.8 0.725,3.8 0.8,3.5 0.8,2.3 ; 2.075,-1.7 2.825,-1.7 2.825,-0.9 ; 2.075,-1.3 ccw(c2.475,-1.3) 2.475,-1.7 2.575,-1.7 2.575,-1.5 2.475,-1.5 cw(c2.475,-1.3) 2.275,-1.3 2.275,1.3 cw(c2.475,1.3) 2.475,1.5 2.575,1.5 2.575,1.7 2.475,1.7 ccw(c2.475,1.3) 2.075,1.3 ; 2.075,1.7 2.825,1.7 2.825,0.9 ; 2.275,-0.9 3.575,-0.9 3.575,0.9 2.275,0.9 ; -2.075,-2.7 0,-2.7 2.075,-2.7 2.075,2.3 0,2.3 -2.075,2.3 -2.075,-2.7
Mechanical 15:
  lines w0.05: -3.925,-1.35 -3.075,-1.35 -3.075,-1.95 -2.325,-1.95 -2.325,-2.95 0,-2.95 2.325,-2.95 2.325,-1.95 3.075,-1.95 3.075,-1.35 3.925,-1.35 3.925,1.35 3.075,1.35 3.075,1.95 2.325,1.95 2.325,2.55 1.225,2.55 1.225,4.45 0,4.45 -1.225,4.45 -1.225,2.55 -2.325,2.55 -2.325,1.95 -3.075,1.95 -3.075,1.35 -3.925,1.35 -3.925,-1.35
3D body "HIROSE_DF13-2P-1.25H(50).stp": height 3.6, standoff -0.8, extent -3.575,-2.7 3.575,3.8
